# Altium footprint library PcbLib_ICs.PcbLib: 317 footprints (part 21 of 24) (continued)
## TQFP-44 [mm] "TQFP-44 10x10mm package with 0.8mm pitch"
height 1.2
pads (44):
  rect 1.45x0.55 smd paste+0 mask+0.08: 1(-5.725,4)
  oval 1.45x0.55 smd paste+0 mask+0.08: 2(-5.725,3.2) 3(-5.725,2.4) 4(-5.725,1.6) 5(-5.725,0.8) 6(-5.725,0) 7(-5.725,-0.8) 8(-5.725,-1.6) 9(-5.725,-2.4) 10(-5.725,-3.2) 11(-5.725,-4) 23(5.725,-4) 24(5.725,-3.2) 25(5.725,-2.4) 26(5.725,-1.6) 27(5.725,-0.8) 28(5.725,0) 29(5.725,0.8) 30(5.725,1.6) 31(5.725,2.4) 32(5.725,3.2) 33(5.725,4)
  oval 0.55x1.45 smd paste+0 mask+0.08: 12(-4,-5.725) 13(-3.2,-5.725) 14(-2.4,-5.725) 15(-1.6,-5.725) 16(-0.8,-5.725) 17(0,-5.725) 18(0.8,-5.725) 19(1.6,-5.725) 20(2.4,-5.725) 21(3.2,-5.725) 22(4,-5.725) 34(4,5.725) 35(3.2,5.725) 36(2.4,5.725) 37(1.6,5.725) 38(0.8,5.725) 39(0,5.725) 40(-0.8,5.725) 41(-1.6,5.725) 42(-2.4,5.725) 43(-3.2,5.725) 44(-4,5.725)
Top Overlay:
  circle w0.6: c-3.6,3.6 r0.3
  circle w0.25: c-5.725,4.825 r0.125
  lines w0.2: -5.2,-4.5 -5.2,-5.2 -4.5,-5.2 ; -5.2,4.5 -5.2,5.2 -4.5,5.2 ; 4.5,-5.2 5.2,-5.2 5.2,-4.5 ; 4.5,5.2 5.2,5.2 5.2,4.5
Top Assy:
  drawing of 665 lines, arcs and shapes, not listed
  text ".Designator" at -3.443,-0.467 h2
Top Text:
  lines w0.05: -6.7,-6.7 6.7,-6.7 6.7,6.7 -6.7,6.7 -6.7,-6.7
  lines w0.1: -0.5,0 0.5,0 ; 0,-0.5 0,0.5
3D body "User Library-TQFP44-1.step": height 1.1, standoff 0, extent -6.009,-6.009 6.009,6.009

## TQFP-100 (14x20) [mm] "TQFP, 100-Leads, Body 14.00x20.00mm, Pitch 0.65mm, IPC Medium Density"
height 1.45
pads (100):
  rect 1.45x0.5 smd paste+0 mask+0.075: 1(-7.725,9.425)
  oval 1.45x0.5 smd paste+0 mask+0.075: 2(-7.725,8.775) 3(-7.725,8.125) 4(-7.725,7.475) 5(-7.725,6.825) 6(-7.725,6.175) 7(-7.725,5.525) 8(-7.725,4.875) 9(-7.725,4.225) 10(-7.725,3.575) 11(-7.725,2.925) 12(-7.725,2.275) 13(-7.725,1.625) 14(-7.725,0.975) 15(-7.725,0.325) 16(-7.725,-0.325) 17(-7.725,-0.975) 18(-7.725,-1.625) 19(-7.725,-2.275) 20(-7.725,-2.925) 21(-7.725,-3.575) 22(-7.725,-4.225) 23(-7.725,-4.875) 24(-7.725,-5.525) 25(-7.725,-6.175) 26(-7.725,-6.825) 27(-7.725,-7.475) 28(-7.725,-8.125) 29(-7.725,-8.775) 30(-7.725,-9.425) 51(7.725,-9.425) 52(7.725,-8.775) 53(7.725,-8.125) 54(7.725,-7.475) 55(7.725,-6.825) 56(7.725,-6.175) 57(7.725,-5.525) 58(7.725,-4.875) 59(7.725,-4.225) 60(7.725,-3.575) 61(7.725,-2.925) 62(7.725,-2.275) 63(7.725,-1.625) 64(7.725,-0.975) 65(7.725,-0.325) 66(7.725,0.325) 67(7.725,0.975) 68(7.725,1.625) 69(7.725,2.275) 70(7.725,2.925) 71(7.725,3.575) 72(7.725,4.225) 73(7.725,4.875) 74(7.725,5.525) 75(7.725,6.175) 76(7.725,6.825) 77(7.725,7.475) 78(7.725,8.125) 79(7.725,8.775) 80(7.725,9.425)
  oval 0.5x1.45 smd paste+0 mask+0.075: 31(-6.175,-10.725) 32(-5.525,-10.725) 33(-4.875,-10.725) 34(-4.225,-10.725) 35(-3.575,-10.725) 36(-2.925,-10.725) 37(-2.275,-10.725) 38(-1.625,-10.725) 39(-0.975,-10.725) 40(-0.325,-10.725) 41(0.325,-10.725) 42(0.975,-10.725) 43(1.625,-10.725) 44(2.275,-10.725) 45(2.925,-10.725) 46(3.575,-10.725) 47(4.225,-10.725) 48(4.875,-10.725) 49(5.525,-10.725) 50(6.175,-10.725) 81(6.175,10.725) 82(5.525,10.725) 83(4.875,10.725) 84(4.225,10.725) 85(3.575,10.725) 86(2.925,10.725) 87(2.275,10.725) 88(1.625,10.725) 89(0.975,10.725) 90(0.325,10.725) 91(-0.325,10.725) 92(-0.975,10.725) 93(-1.625,10.725) 94(-2.275,10.725) 95(-2.925,10.725) 96(-3.575,10.725) 97(-4.225,10.725) 98(-4.875,10.725) 99(-5.525,10.725) 100(-6.175,10.725)
Top Overlay:
  circle w0.6: c-5.6,8.6 r0.3
  circle w0.25: c-7.725,10.225 r0.125
  lines w0.2: -9.425,-9.425 -8.775,-9.425 ; -9.425,-2.925 -8.775,-2.925 ; -9.425,3.575 -8.775,3.575 ; -9.425,9.425 -8.775,9.425 ; -7.225,-9.975 -7.225,-10.225 -6.725,-10.225 ; -7.225,9.975 -7.225,10.225 -6.725,10.225 ; -6.175,-12.35 -6.175,-11.7 ; -6.175,11.7 -6.175,12.35 ; -0.325,-12.35 -0.325,-11.7 ; 0.325,11.7 0.325,12.35 ; 6.175,-12.35 6.175,-11.7 ; 6.175,11.7 6.175,12.35 ; 6.725,-10.225 7.225,-10.225 7.225,-9.975 ; 6.725,10.225 7.225,10.225 7.225,9.975 ; 8.775,-9.425 9.425,-9.425 ; 8.775,-3.575 9.425,-3.575 ; 8.775,2.925 9.425,2.925 ; 8.775,9.425 9.425,9.425 ; -6.6,-9.6 6.6,-9.6 6.6,9.6 -6.6,9.6 -6.6,-9.6
Top Assy:
  drawing of 2638 lines, arcs and shapes, not listed
  text ".Designator" at -3.443,-0.467 h2
Top Text:
  lines w0.05: -8.7,-11.7 8.7,-11.7 8.7,11.7 -8.7,11.7 -8.7,-11.7
  lines w0.1: -0.5,0 0.5,0 ; 0,-0.5 0,0.5
3D body "TQFP-100 (14x20).step": height 1.45, standoff 0, extent -8,-11 8,11

## TSOC-6 [mm]
height 1.1
pads (6):
  rect 1.3x0.55 smd paste+0 mask+0.05: 1(-1.88,1.27)
  oval 1.3x0.55 smd paste+0 mask+0.05: 2(-1.88,0) 3(-1.88,-1.27) 4(1.88,-1.27) 5(1.88,0) 6(1.88,1.27)
Top Overlay:
  circle w0.25: c-3,2 r0.125
  lines w0.2: -2.3,-1.8 -2.3,-2.2 2.3,-2.2 2.3,-1.8 ; -2.3,1.8 -2.3,2.2 2.3,2.2 2.3,1.8
Top Assy:
  circle w0.05: c-1.159,1.303 r0.15
  lines w0.05: -1.859,-1.467 -2.059,-1.467 -2.059,-1.067 -1.859,-1.067 ; -1.859,-0.197 -2.059,-0.197 -2.059,0.203 -1.859,0.203 ; -1.859,1.073 -2.059,1.073 -2.059,1.473 -1.859,1.473 ; 1.929,-1.467 1.941,-1.467 ; 1.929,-1.067 1.941,-1.067 ; 1.929,-0.197 1.941,-0.197 ; 1.929,0.203 1.941,0.203 ; 1.929,1.073 1.941,1.073 ; 1.929,1.473 1.941,1.473 ; -1.859,-1.897 ccw(c-1.759,-1.897) -1.759,-1.997 -1.738,-1.997 ; -1.859,-1.897 -1.826,-1.897 ; -1.859,-1.897 -1.859,1.903 ; -1.859,1.903 cw(c-1.759,1.903) -1.829,1.974 cw(c-1.759,1.903) -1.759,2.003 -1.738,2.003 ; -1.859,1.903 -1.826,1.903 ; -1.826,-1.897 ccw(c-1.732,-1.903) -1.738,-1.997 ; -1.826,-1.897 -1.738,-1.897 ; -1.826,-1.897 -1.826,1.903 ; -1.826,1.903 cw(c-1.732,1.91) -1.738,2.003 ; -1.826,1.903 -1.738,1.903 ; -1.738,-1.997 -1.738,-1.897 ; -1.738,-1.997 1.732,-1.997 ; -1.738,-1.897 1.732,-1.897 ; -1.738,-1.897 -1.738,1.903 ; -1.738,1.903 -1.738,2.003 ; -1.738,1.903 1.732,1.903 ; -1.738,2.003 1.732,2.003 ; 1.732,-1.997 1.749,-1.994 1.762,-1.986 1.78,-1.967 1.789,-1.951 1.795,-1.933 1.8,-1.897 ; 1.732,-1.997 1.732,-1.897 ; 1.732,-1.997 1.841,-1.997 ccw(c1.841,-1.897) 1.941,-1.897 ; 1.732,-1.897 1.732,1.903 ; 1.732,-1.897 1.8,-1.897 ; 1.732,1.903 1.732,2.003 ; 1.732,1.903 1.8,1.903 ; 1.732,2.003 1.749,2 1.763,1.993 1.78,1.974 1.789,1.957 1.795,1.939 1.8,1.903 ; 1.732,2.003 1.841,2.003 cw(c1.841,1.903) 1.912,1.974 cw(c1.841,1.903) 1.941,1.903 ; 1.799,-1.897 1.941,-1.897 ; 1.799,-1.897 1.799,1.903 ; 1.799,1.903 1.941,1.903 ; 1.941,-1.897 1.941,-1.467 ; 1.941,-1.467 1.941,-1.067 ; 1.941,-1.467 2.141,-1.467 2.141,-1.067 1.941,-1.067 ; 1.941,-1.067 1.941,-0.197 ; 1.941,-0.197 1.941,0.203 ; 1.941,-0.197 2.141,-0.197 2.141,0.203 1.941,0.203 ; 1.941,0.203 1.941,1.073 ; 1.941,1.073 1.941,1.473 ; 1.941,1.073 2.141,1.073 2.141,1.473 1.941,1.473 ; 1.941,1.473 1.941,1.903
  text ".Designator" at -2.579,-0.349 h1.5
Top Text:
  lines w0.05: -2.7,-2.4 -2.7,2.4 2.7,2.4 2.7,-2.4 -2.7,-2.4
  lines w0.1: -0.5,0 0.5,0 ; 0,-0.5 0,0.5
3D body "User Library-TSOC6.STEP": height 1.4, standoff 0, extent -2.1,-2 2.1,2

## TSOP-5 [mm] "TSOP-5 package"
height 1.75
pads (5):
  rect 1.1x0.6 smd paste+0 mask+0.05: 1(-1.2,0.95)
  oval 1.1x0.6 smd paste+0 mask+0.05: 2(-1.2,0) 3(-1.2,-0.95) 4(1.2,-0.95) 5(1.2,0.95)
Top Overlay:
  circle w0.25: c-1.5,1.75 r0.125
  lines w0.2: -0.55,-1.6 0.55,-1.6 ; -0.55,1.6 0.55,1.6
Top Assy:
  circle w0.05: c-0.35,1 r0.1
  lines w0.05: 0.75,-0.16 0.75,-0.79 ; 0.75,-0.15 0.75,0.79 ; -1.176,-1.11 -1.148,-1.11 ; -1.176,-1.11 -1.35,-1.11 -1.35,-0.79 -1.176,-0.79 ; -1.176,-1.11 -1.176,-0.79 ; -1.176,-0.79 -1.148,-0.79 ; -1.176,-0.16 -1.148,-0.16 ; -1.176,-0.16 -1.35,-0.16 -1.35,0.16 -1.176,0.16 ; -1.176,-0.16 -1.176,0.16 ; -1.176,0.16 -1.148,0.16 ; -1.176,0.79 -1.148,0.79 ; -1.176,0.79 -1.35,0.79 -1.35,1.11 -1.176,1.11 ; -1.176,0.79 -1.176,1.11 ; -1.176,1.11 -1.148,1.11 ; -1.148,-1.11 -1.148,-0.79 ; -1.148,-1.11 -0.82,-1.11 ; -1.148,-0.79 -0.82,-0.79 ; -1.148,-0.16 -1.148,0.16 ; -1.148,-0.16 -0.82,-0.16 ; -1.148,0.16 -0.82,0.16 ; -1.148,0.79 -1.148,1.11 ; -1.148,0.79 -0.82,0.79 ; -1.148,1.11 -0.82,1.11 ; -0.82,-1.11 -0.75,-1.11 ; -0.82,-1.11 -0.82,-0.79 ; -0.82,-0.79 -0.75,-0.79 ; -0.82,-0.16 -0.75,-0.16 ; -0.82,-0.16 -0.82,0.16 ; -0.82,0.16 -0.75,0.16 ; -0.82,0.79 -0.75,0.79 ; -0.82,0.79 -0.82,1.11 ; -0.82,1.11 -0.75,1.11 ; -0.75,-1.5 -0.623,-1.373 ; -0.75,-1.5 0.75,-1.5 ; -0.75,-1.5 -0.75,-1.11 ; -0.75,-1.11 -0.75,-0.79 ; -0.75,-0.79 -0.75,-0.16 ; -0.75,-0.16 -0.75,0.16 ; -0.75,0.16 -0.75,0.79 ; -0.75,0.79 -0.75,1.11 ; -0.75,1.11 -0.75,1.5 ; -0.75,1.5 -0.623,1.373 ; -0.75,1.5 0.75,1.5 ; -0.623,-1.373 0.623,-1.373 ; -0.623,-1.373 -0.623,1.373 ; -0.623,1.373 0.623,1.373 ; 0.623,-1.373 0.623,1.373 ; 0.623,-1.373 0.75,-1.5 ; 0.623,1.373 0.75,1.5 ; 0.75,-1.5 0.75,-1.11 ; 0.75,-1.11 0.75,-0.79 ; 0.75,-1.11 0.82,-1.11 ; 0.75,-0.79 0.82,-0.79 ; 0.75,0.79 0.75,1.11 ; 0.75,0.79 0.82,0.79 ; 0.75,1.11 0.75,1.5 ; 0.75,1.11 0.82,1.11 ; 0.82,-1.11 1.148,-1.11 ; 0.82,-1.11 0.82,-0.79 ; 0.82,-0.79 1.148,-0.79 ; 0.82,0.79 1.148,0.79 ; 0.82,0.79 0.82,1.11 ; 0.82,1.11 1.148,1.11 ; 1.148,-1.11 1.148,-0.79 ; 1.148,-1.11 1.176,-1.11 ; 1.148,-0.79 1.176,-0.79 ; 1.148,0.79 1.148,1.11 ; 1.148,0.79 1.176,0.79 ; 1.148,1.11 1.176,1.11 ; 1.176,-1.11 1.35,-1.11 1.35,-0.79 1.176,-0.79 ; 1.176,-1.11 1.176,-0.79 ; 1.176,0.79 1.35,0.79 1.35,1.11 1.176,1.11 ; 1.176,0.79 1.176,1.11
  text ".Designator" at 0.28,-2.064 h1.2
Top Text:
  lines w0.1: -0.5,0 0.5,0 ; 0,-0.5 0,0.5
3D body "5-TSOP.step": height 1.1, standoff 0, extent -1.5,-1.55 1.5,1.55

## TSOP-6 [mm] "TSOP-6 package"
height 1.75
pads (6):
  rect 1.1x0.6 smd paste+0 mask+0.05: 1(-1.1,0.95)
  oval 1.1x0.6 smd paste+0 mask+0.05: 2(-1.1,0) 3(-1.1,-0.95) 4(1.1,-0.95) 5(1.1,0) 6(1.1,0.95)
Top Overlay:
  circle w0.25: c-1.5,1.75 r0.125
  lines w0.2: -0.55,-1.6 0.55,-1.6 ; -0.55,1.6 0.55,1.6
Top Assy:
  circle w0.05: c-0.35,1 r0.1
  lines w0.05: -1.176,-1.11 -1.176,-0.79 ; -1.176,-1.11 -1.35,-1.11 -1.35,-0.79 -1.176,-0.79 ; -1.176,-1.11 -1.148,-1.11 ; -1.176,-0.79 -1.148,-0.79 ; -1.176,-0.16 -1.176,0.16 ; -1.176,-0.16 -1.35,-0.16 -1.35,0.16 -1.176,0.16 ; -1.176,-0.16 -1.148,-0.16 ; -1.176,0.16 -1.148,0.16 ; -1.176,0.79 -1.176,1.11 ; -1.176,0.79 -1.35,0.79 -1.35,1.11 -1.176,1.11 ; -1.176,0.79 -1.148,0.79 ; -1.176,1.11 -1.148,1.11 ; -1.148,-1.11 -0.82,-1.11 ; -1.148,-1.11 -1.148,-0.79 ; -1.148,-0.79 -0.82,-0.79 ; -1.148,-0.16 -0.82,-0.16 ; -1.148,-0.16 -1.148,0.16 ; -1.148,0.16 -0.82,0.16 ; -1.148,0.79 -0.82,0.79 ; -1.148,0.79 -1.148,1.11 ; -1.148,1.11 -0.82,1.11 ; -0.82,-1.11 -0.82,-0.79 ; -0.82,-1.11 -0.75,-1.11 ; -0.82,-0.79 -0.75,-0.79 ; -0.82,-0.16 -0.82,0.16 ; -0.82,-0.16 -0.75,-0.16 ; -0.82,0.16 -0.75,0.16 ; -0.82,0.79 -0.82,1.11 ; -0.82,0.79 -0.75,0.79 ; -0.82,1.11 -0.75,1.11 ; -0.75,-1.5 -0.75,-1.11 ; -0.75,-1.5 0.75,-1.5 ; -0.75,-1.5 -0.623,-1.373 ; -0.75,-1.11 -0.75,-0.79 ; -0.75,-0.79 -0.75,-0.16 ; -0.75,-0.16 -0.75,0.16 ; -0.75,0.16 -0.75,0.79 ; -0.75,0.79 -0.75,1.11 ; -0.75,1.11 -0.75,1.5 ; -0.75,1.5 0.75,1.5 ; -0.75,1.5 -0.623,1.373 ; -0.623,-1.373 -0.623,1.373 ; -0.623,-1.373 0.623,-1.373 ; -0.623,1.373 0.623,1.373 ; 0.623,-1.373 0.75,-1.5 ; 0.623,-1.373 0.623,1.373 ; 0.623,1.373 0.75,1.5 ; 0.75,-1.5 0.75,-1.11 ; 0.75,-1.11 0.82,-1.11 ; 0.75,-1.11 0.75,-0.79 ; 0.75,-0.79 0.82,-0.79 ; 0.75,-0.79 0.75,-0.16 ; 0.75,-0.16 0.82,-0.16 ; 0.75,-0.16 0.75,0.16 ; 0.75,0.16 0.82,0.16 ; 0.75,0.16 0.75,0.79 ; 0.75,0.79 0.82,0.79 ; 0.75,0.79 0.75,1.11 ; 0.75,1.11 0.82,1.11 ; 0.75,1.11 0.75,1.5 ; 0.82,-1.11 0.82,-0.79 ; 0.82,-1.11 1.148,-1.11 ; 0.82,-0.79 1.148,-0.79 ; 0.82,-0.16 0.82,0.16 ; 0.82,-0.16 1.148,-0.16 ; 0.82,0.16 1.148,0.16 ; 0.82,0.79 0.82,1.11 ; 0.82,0.79 1.148,0.79 ; 0.82,1.11 1.148,1.11 ; 1.148,-1.11 1.176,-1.11 ; 1.148,-1.11 1.148,-0.79 ; 1.148,-0.79 1.176,-0.79 ; 1.148,-0.16 1.176,-0.16 ; 1.148,-0.16 1.148,0.16 ; 1.148,0.16 1.176,0.16 ; 1.148,0.79 1.176,0.79 ; 1.148,0.79 1.148,1.11 ; 1.148,1.11 1.176,1.11 ; 1.176,-1.11 1.176,-0.79 ; 1.176,-1.11 1.35,-1.11 1.35,-0.79 1.176,-0.79 ; 1.176,-0.16 1.176,0.16 ; 1.176,-0.16 1.35,-0.16 1.35,0.16 1.176,0.16 ; 1.176,0.79 1.176,1.11 ; 1.176,0.79 1.35,0.79 1.35,1.11 1.176,1.11
  text ".Designator" at 0.28,-2.064 h1.2
Top Text:
  lines w0.1: -0.5,0 0.5,0 ; 0,-0.5 0,0.5
3D body "User Library-TSOP-6.step": height 1, standoff 0, extent -1.35,-1.5 1.35,1.5

## TSOP-44 II [mm]
height 1.2
pads (44):
  rect 1.2x0.5 smd paste+0 mask+0.05: 1(-5.7,8.4)
  oval 1.2x0.5 smd paste+0 mask+0.05: 2(-5.7,7.6) 3(-5.7,6.8) 4(-5.7,6) 5(-5.7,5.2) 6(-5.7,4.4) 7(-5.7,3.6) 8(-5.7,2.8) 9(-5.7,2) 10(-5.7,1.2) 11(-5.7,0.4) 12(-5.7,-0.4) 13(-5.7,-1.2) 14(-5.7,-2) 15(-5.7,-2.8) 16(-5.7,-3.6) 17(-5.7,-4.4) 18(-5.7,-5.2) 19(-5.7,-6) 20(-5.7,-6.8) 21(-5.7,-7.6) 22(-5.7,-8.4) 23(5.7,8.4) 24(5.7,7.6) 25(5.7,6.8) 26(5.7,6) 27(5.7,5.2) 28(5.7,4.4) 29(5.7,3.6) 30(5.7,2.8) 31(5.7,2) 32(5.7,1.2) 33(5.7,0.4) 34(5.7,-0.4) 35(5.7,-1.2) 36(5.7,-2) 37(5.7,-2.8) 38(5.7,-3.6) 39(5.7,-4.4) 40(5.7,-5.2) 41(5.7,-6) 42(5.7,-6.8) 43(5.7,-7.6) 44(5.7,-8.4)
Top Overlay:
  circle w0.6: c-3.58,7.705 r0.3
  circle w0.25: c-5.7,9.2 r0.125
  lines w0.2: -4.8,-8.9 -4.8,8.9 4.8,8.9 4.8,-8.9 -4.8,-8.9
Top Assy:
  drawing of 1189 lines, arcs and shapes, not listed
  text ".Designator" at -3.443,-0.467 h2
Top Text:
  lines w0.1: -0.5,0 0.5,0 ; 0,-0.5 0,0.5
3D body "TSOP-44_II.STEP": height 1.1, standoff 0, extent -5.88,-9.205 5.88,9.205

## TSOP-48 I [mm] "TSSOP, 48-Leads, Body 12,00x18,40mm, Pitch 0,50mm, IPC Medium Density"
height 1.2
pads (48):
  rect 1.15x0.3 smd paste+0 mask+0.05: 1(-9.875,5.75)
  oval 1.15x0.3 smd paste+0 mask+0.05: 2(-9.875,5.25) 3(-9.875,4.75) 4(-9.875,4.25) 5(-9.875,3.75) 6(-9.875,3.25) 7(-9.875,2.75) 8(-9.875,2.25) 9(-9.875,1.75) 10(-9.875,1.25) 11(-9.875,0.75) 12(-9.875,0.25) 13(-9.875,-0.25) 14(-9.875,-0.75) 15(-9.875,-1.25) 16(-9.875,-1.75) 17(-9.875,-2.25) 18(-9.875,-2.75) 19(-9.875,-3.25) 20(-9.875,-3.75) 21(-9.875,-4.25) 22(-9.875,-4.75) 23(-9.875,-5.25) 24(-9.875,-5.75) 25(9.875,-5.75) 26(9.875,-5.25) 27(9.875,-4.75) 28(9.875,-4.25) 29(9.875,-3.75) 30(9.875,-3.25) 31(9.875,-2.75) 32(9.875,-2.25) 33(9.875,-1.75) 34(9.875,-1.25) 35(9.875,-0.75) 36(9.875,-0.25) 37(9.875,0.25) 38(9.875,0.75) 39(9.875,1.25) 40(9.875,1.75) 41(9.875,2.25) 42(9.875,2.75) 43(9.875,3.25) 44(9.875,3.75) 45(9.875,4.25) 46(9.875,4.75) 47(9.875,5.25) 48(9.875,5.75)
Top Overlay:
  circle w0.6: c-7.9,5.1 r0.3
  circle w0.25: c-9.875,6.45 r0.125
  lines w0.2: -8.9,-6.1 8.9,-6.1 8.9,6.1 -8.9,6.1 -8.9,-6.1
Top Assy:
  drawing of 731 lines, arcs and shapes, not listed
  text ".Designator" at -3.443,-0.467 h2
Top Text:
  lines w0.05: -10.7,-6.35 10.7,-6.35 10.7,6.35 -10.7,6.35 -10.7,-6.35
  lines w0.1: -0.5,0 0.5,0 ; 0,-0.5 0,0.5
3D body "User Library-TSOP-48.STEP": height 1.05, standoff -0.05, extent -10.002,-6 10.002,6

## TSOP-86 II [mm] "TSOP, 86-Leads, Body 22,22x10,16mm, Pitch 0,50mm, IPC Medium Density"
height 1.2
pads (86):
  rect 1.2x0.3 smd paste+0 mask+0.05: 1(-5.75,10.5)
  oval 1.2x0.3 smd paste+0 mask+0.05: 2(-5.75,10) 3(-5.75,9.5) 4(-5.75,9) 5(-5.75,8.5) 6(-5.75,8) 7(-5.75,7.5) 8(-5.75,7) 9(-5.75,6.5) 10(-5.75,6) 11(-5.75,5.5) 12(-5.75,5) 13(-5.75,4.5) 14(-5.75,4) 15(-5.75,3.5) 16(-5.75,3) 17(-5.75,2.5) 18(-5.75,2) 19(-5.75,1.5) 20(-5.75,1) 21(-5.75,0.5) 22(-5.75,0) 23(-5.75,-0.5) 24(-5.75,-1) 25(-5.75,-1.5) 26(-5.75,-2) 27(-5.75,-2.5) 28(-5.75,-3) 29(-5.75,-3.5) 30(-5.75,-4) 31(-5.75,-4.5) 32(-5.75,-5) 33(-5.75,-5.5) 34(-5.75,-6) 35(-5.75,-6.5) 36(-5.75,-7) 37(-5.75,-7.5) 38(-5.75,-8) 39(-5.75,-8.5) 40(-5.75,-9) 41(-5.75,-9.5) 42(-5.75,-10) 43(-5.75,-10.5) 44(5.75,-10.5) 45(5.75,-10) 46(5.75,-9.5) 47(5.75,-9) 48(5.75,-8.5) 49(5.75,-8) 50(5.75,-7.5) 51(5.75,-7) 52(5.75,-6.5) 53(5.75,-6) 54(5.75,-5.5) 55(5.75,-5) 56(5.75,-4.5) 57(5.75,-4) 58(5.75,-3.5) 59(5.75,-3) 60(5.75,-2.5) 61(5.75,-2) 62(5.75,-1.5) 63(5.75,-1) 64(5.75,-0.5) 65(5.75,0) 66(5.75,0.5) 67(5.75,1) 68(5.75,1.5) 69(5.75,2) 70(5.75,2.5) 71(5.75,3) 72(5.75,3.5) 73(5.75,4) 74(5.75,4.5) 75(5.75,5) 76(5.75,5.5) 77(5.75,6) 78(5.75,6.5) 79(5.75,7) 80(5.75,7.5) 81(5.75,8) 82(5.75,8.5) 83(5.75,9) 84(5.75,9.5) 85(5.75,10) 86(5.75,10.5)
Top Overlay:
  circle w0.25: c-5.75,11.2 r0.125
  circle w0.6: c-3.75,10.175 r0.3
  lines w0.2: -4.75,-11.175 -4.75,11.175 4.75,11.175 4.75,-11.175 -4.75,-11.175
Top Assy:
  drawing of 1393 lines, arcs and shapes, not listed
Top Text:
  lines w0.05: -6.6,-11.45 -6.6,11.45 6.6,11.45 6.6,-11.45 -6.6,-11.45
  lines w0.1: -0.5,0 0.5,0 ; 0,-0.5 0,0.5
3D body "User Library-TSOP-86.STEP": height 1.06, standoff -0.03, extent -5.895,-10.994 5.895,11

## TSOT23-5 [mm] "SOT23, 5-Leads, Body 2,90x2,80mm, Pitch 0,95mm, IPC Medium Density"
height 1
pads (5):
  rect 0.95x0.55 smd paste+0 mask+0.05: 1(-1.35,0.95)
  oval 0.95x0.55 smd paste+0 mask+0.05: 2(-1.35,0) 3(-1.35,-0.95) 4(1.35,-0.95) 5(1.35,0.95)
Top Overlay:
  circle w0.25: c-1.35,1.775 r0.125
  lines w0.2: -0.5,-1.5 -0.5,1.5 0.5,1.5 0.5,-1.5 -0.5,-1.5
Top Assy:
  circle w0.05: c-0.4,1.1 r0.1
  lines w0.05: -0.813,-1.138 -0.813,-1.45 ; -0.813,-0.763 -0.813,-0.188 ; -0.813,0.187 -0.813,0.762 ; -0.813,1.137 -0.813,1.45 ; 0.813,-1.138 0.813,-1.45 ; 0.813,-0.763 0.813,0.762 ; 0.813,1.137 0.813,1.45 ; -1.232,-1.138 -1.232,-0.763 ; -1.232,-1.138 -1.399,-1.138 -1.399,-0.763 -1.232,-0.763 ; -1.232,-1.138 -1.213,-1.138 ; -1.232,-0.763 -1.213,-0.763 ; -1.232,-0.188 -1.232,0.187 ; -1.232,-0.188 -1.399,-0.188 -1.399,0.187 -1.232,0.187 ; -1.232,-0.188 -1.213,-0.188 ; -1.232,0.187 -1.213,0.187 ; -1.232,0.762 -1.232,1.137 ; -1.232,0.762 -1.399,0.762 -1.399,1.137 -1.232,1.137 ; -1.232,0.762 -1.213,0.762 ; -1.232,1.137 -1.213,1.137 ; -1.213,-1.138 -1.213,-0.763 ; -1.213,-1.138 -1.058,-1.138 ; -1.213,-0.763 -1.058,-0.763 ; -1.213,-0.188 -1.213,0.187 ; -1.213,-0.188 -1.058,-0.188 ; -1.213,0.187 -1.058,0.187 ; -1.213,0.762 -1.213,1.137 ; -1.213,0.762 -1.058,0.762 ; -1.213,1.137 -1.058,1.137 ; -1.058,-1.138 -1.058,-0.763 ; -1.058,-1.138 -0.898,-1.138 ; -1.058,-0.763 -0.898,-0.763 ; -1.058,-0.188 -1.058,0.187 ; -1.058,-0.188 -0.898,-0.188 ; -1.058,0.187 -0.898,0.187 ; -1.058,0.762 -1.058,1.137 ; -1.058,0.762 -0.898,0.762 ; -1.058,1.137 -0.898,1.137 ; -0.898,-1.138 -0.898,-0.763 ; -0.898,-1.138 -0.76,-1.138 -0.76,-0.763 -0.898,-0.763 ; -0.898,-0.188 -0.898,0.187 ; -0.898,-0.188 -0.76,-0.188 -0.76,0.187 -0.898,0.187 ; -0.898,0.762 -0.898,1.137 ; -0.898,0.762 -0.76,0.762 -0.76,1.137 -0.898,1.137 ; -0.813,-1.45 0.813,-1.45 ; -0.813,-1.45 -0.663,-1.35 ; -0.813,1.45 0.813,1.45 ; -0.813,1.45 -0.663,1.35 ; -0.663,-1.35 0.663,-1.35 ; -0.663,-1.35 -0.663,1.35 ; -0.663,1.35 0.663,1.35 ; 0.663,-1.35 0.663,1.35 ; 0.663,-1.35 0.813,-1.45 ; 0.663,1.35 0.813,1.45 ; 0.898,-1.138 0.898,-0.763 ; 0.898,-1.138 1.058,-1.138 ; 0.898,-1.138 0.76,-1.138 0.76,-0.763 0.898,-0.763 ; 0.898,-0.763 1.058,-0.763 ; 0.898,0.762 0.898,1.137 ; 0.898,0.762 1.058,0.762 ; 0.898,0.762 0.76,0.762 0.76,1.137 0.898,1.137 ; 0.898,1.137 1.058,1.137 ; 1.058,-1.138 1.058,-0.763 ; 1.058,-1.138 1.213,-1.138 ; 1.058,-0.763 1.213,-0.763 ; 1.058,0.762 1.058,1.137 ; 1.058,0.762 1.213,0.762 ; 1.058,1.137 1.213,1.137 ; 1.213,-1.138 1.213,-0.763 ; 1.213,-1.138 1.232,-1.138 ; 1.213,-0.763 1.232,-0.763 ; 1.213,0.762 1.213,1.137 ; 1.213,0.762 1.232,0.762 ; 1.213,1.137 1.232,1.137 ; 1.232,-1.138 1.232,-0.763 ; 1.232,-1.138 1.399,-1.138 1.399,-0.763 1.232,-0.763 ; 1.232,0.762 1.232,1.137 ; 1.232,0.762 1.399,0.762 1.399,1.137 1.232,1.137
  text ".Designator" at 0.233,-1.719 h1
Top Text:
  lines w0.05: -2.075,-1.75 2.075,-1.75 2.075,1.75 -2.075,1.75 -2.075,-1.75
  lines w0.1: -0.5,0 0.5,0 ; 0,-0.5 0,0.5
3D body "TSOT23-5.step": height 1, standoff 0, extent -1.4,-1.5 1.4,1.5

## TSOT23-6 [mm]
pads (6):
  rect 1.3x0.65 smd paste+0 mask+0.05: 1(-1.31,0.95)
  oval 1.3x0.65 smd paste+0 mask+0.05: 2(-1.31,0) 3(-1.31,-0.95) 4(1.31,-0.95) 5(1.31,0) 6(1.31,0.95)
Top Overlay:
  circle w0.25: c-1.4,1.8 r0.125
  lines w0.2: -0.663,-1.5 0.663,-1.5 ; -0.663,1.5 0.663,1.5
Top Assy:
  circle w0.05: c-0.4,1.1 r0.1
  lines w0.05: -0.813,-1.138 -0.813,-1.45 ; -0.813,-0.763 -0.813,-0.188 ; -0.813,0.187 -0.813,0.762 ; -0.813,1.137 -0.813,1.45 ; 0.813,-1.138 0.813,-1.45 ; 0.813,-0.763 0.813,-0.188 ; 0.813,0.187 0.813,0.762 ; 0.813,1.137 0.813,1.45 ; -1.232,-1.138 -1.213,-1.138 ; -1.232,-1.138 -1.399,-1.138 -1.399,-0.763 -1.232,-0.763 ; -1.232,-1.138 -1.232,-0.763 ; -1.232,-0.763 -1.213,-0.763 ; -1.232,-0.188 -1.213,-0.188 ; -1.232,-0.188 -1.399,-0.188 -1.399,0.187 -1.232,0.187 ; -1.232,-0.188 -1.232,0.187 ; -1.232,0.187 -1.213,0.187 ; -1.232,0.762 -1.213,0.762 ; -1.232,0.762 -1.399,0.762 -1.399,1.137 -1.232,1.137 ; -1.232,0.762 -1.232,1.137 ; -1.232,1.137 -1.213,1.137 ; -1.213,-1.138 -1.058,-1.138 ; -1.213,-1.138 -1.213,-0.763 ; -1.213,-0.763 -1.058,-0.763 ; -1.213,-0.188 -1.058,-0.188 ; -1.213,-0.188 -1.213,0.187 ; -1.213,0.187 -1.058,0.187 ; -1.213,0.762 -1.058,0.762 ; -1.213,0.762 -1.213,1.137 ; -1.213,1.137 -1.058,1.137 ; -1.058,-1.138 -0.898,-1.138 ; -1.058,-1.138 -1.058,-0.763 ; -1.058,-0.763 -0.898,-0.763 ; -1.058,-0.188 -0.898,-0.188 ; -1.058,-0.188 -1.058,0.187 ; -1.058,0.187 -0.898,0.187 ; -1.058,0.762 -0.898,0.762 ; -1.058,0.762 -1.058,1.137 ; -1.058,1.137 -0.898,1.137 ; -0.898,-1.138 -0.76,-1.138 -0.76,-0.763 -0.898,-0.763 ; -0.898,-1.138 -0.898,-0.763 ; -0.898,-0.188 -0.76,-0.188 -0.76,0.187 -0.898,0.187 ; -0.898,-0.188 -0.898,0.187 ; -0.898,0.762 -0.76,0.762 -0.76,1.137 -0.898,1.137 ; -0.898,0.762 -0.898,1.137 ; -0.813,-1.45 -0.663,-1.35 ; -0.813,-1.45 0.813,-1.45 ; -0.813,1.45 -0.663,1.35 ; -0.813,1.45 0.813,1.45 ; -0.663,-1.35 -0.663,1.35 ; -0.663,-1.35 0.663,-1.35 ; -0.663,1.35 0.663,1.35 ; 0.663,-1.35 0.813,-1.45 ; 0.663,-1.35 0.663,1.35 ; 0.663,1.35 0.813,1.45 ; 0.898,-1.138 0.898,-0.763 ; 0.898,-1.138 1.058,-1.138 ; 0.898,-1.138 0.76,-1.138 0.76,-0.763 0.898,-0.763 ; 0.898,-0.763 1.058,-0.763 ; 0.898,-0.188 0.898,0.187 ; 0.898,-0.188 1.058,-0.188 ; 0.898,-0.188 0.76,-0.188 0.76,0.187 0.898,0.187 ; 0.898,0.187 1.058,0.187 ; 0.898,0.762 0.898,1.137 ; 0.898,0.762 1.058,0.762 ; 0.898,0.762 0.76,0.762 0.76,1.137 0.898,1.137 ; 0.898,1.137 1.058,1.137 ; 1.058,-1.138 1.058,-0.763 ; 1.058,-1.138 1.213,-1.138 ; 1.058,-0.763 1.213,-0.763 ; 1.058,-0.188 1.058,0.187 ; 1.058,-0.188 1.213,-0.188 ; 1.058,0.187 1.213,0.187 ; 1.058,0.762 1.058,1.137 ; 1.058,0.762 1.213,0.762 ; 1.058,1.137 1.213,1.137 ; 1.213,-1.138 1.213,-0.763 ; 1.213,-1.138 1.232,-1.138 ; 1.213,-0.763 1.232,-0.763 ; 1.213,-0.188 1.213,0.187 ; 1.213,-0.188 1.232,-0.188 ; 1.213,0.187 1.232,0.187 ; 1.213,0.762 1.213,1.137 ; 1.213,0.762 1.232,0.762 ; 1.213,1.137 1.232,1.137 ; 1.232,-1.138 1.232,-0.763 ; 1.232,-1.138 1.399,-1.138 1.399,-0.763 1.232,-0.763 ; 1.232,-0.188 1.232,0.187 ; 1.232,-0.188 1.399,-0.188 1.399,0.187 1.232,0.187 ; 1.232,0.762 1.232,1.137 ; 1.232,0.762 1.399,0.762 1.399,1.137 1.232,1.137
  text ".Designator" at 0.233,-1.719 h1
Top Text:
  lines w0.1: -0.5,0 0.5,0 ; 0,-0.5 0,0.5
3D body "User Library-TSOT-23-6(S6).step": height 1, standoff 0, extent -1.412,-1.45 1.412,1.45

## TSSOP-6 [mm]
height 1.1
pads (6):
  rect 0.7x0.3 smd paste+0 mask+0.05: 1(-0.95,0.65)
  oval 0.7x0.3 smd paste+0 mask+0.05: 2(-0.95,0) 3(-0.95,-0.65) 4(0.95,-0.65) 5(0.95,0) 6(0.95,0.65)
Top Overlay:
  circle w0.25: c-1.2,1.3 r0.125
  lines w0.2: -0.7,-1.2 0.7,-1.2 ; -0.7,1.2 0.7,1.2
Top Assy:
  circle w0.05: c-0.375,0.75 r0.15
  lines w0.05: -0.625,-0.775 -0.625,-1 ; -0.625,-0.525 -0.625,-0.125 ; -0.625,0.125 -0.625,0.525 ; -0.625,0.775 -0.625,1 ; 0.625,-0.775 0.625,-1 ; 0.625,-0.525 0.625,-0.125 ; 0.625,0.125 0.625,0.525 ; 0.625,0.775 0.625,1 ; -0.878,-0.775 -0.878,-0.525 ; -0.878,-0.775 -0.828,-0.775 ; -0.878,-0.775 -1.05,-0.775 -1.05,-0.525 -0.878,-0.525 ; -0.878,-0.525 -0.828,-0.525 ; -0.878,-0.125 -0.878,0.125 ; -0.878,-0.125 -0.828,-0.125 ; -0.878,-0.125 -1.05,-0.125 -1.05,0.125 -0.878,0.125 ; -0.878,0.125 -0.828,0.125 ; -0.878,0.525 -0.878,0.775 ; -0.878,0.525 -0.828,0.525 ; -0.878,0.525 -1.05,0.525 -1.05,0.775 -0.878,0.775 ; -0.878,0.775 -0.828,0.775 ; -0.828,-0.775 -0.828,-0.525 ; -0.828,-0.775 -0.796,-0.775 ; -0.828,-0.525 -0.796,-0.525 ; -0.828,-0.125 -0.828,0.125 ; -0.828,-0.125 -0.796,-0.125 ; -0.828,0.125 -0.796,0.125 ; -0.828,0.525 -0.828,0.775 ; -0.828,0.525 -0.796,0.525 ; -0.828,0.775 -0.796,0.775 ; -0.796,-0.775 -0.646,-0.775 ; -0.796,-0.775 -0.796,-0.525 ; -0.796,-0.525 -0.646,-0.525 ; -0.796,-0.125 -0.646,-0.125 ; -0.796,-0.125 -0.796,0.125 ; -0.796,0.125 -0.646,0.125 ; -0.796,0.525 -0.646,0.525 ; -0.796,0.525 -0.796,0.775 ; -0.796,0.775 -0.646,0.775 ; -0.646,-0.775 -0.646,-0.525 ; -0.646,-0.775 -0.615,-0.775 -0.615,-0.525 -0.646,-0.525 ; -0.646,-0.125 -0.615,-0.125 -0.615,0.125 -0.646,0.125 ; -0.646,-0.125 -0.646,0.125 ; -0.646,0.525 -0.646,0.775 ; -0.646,0.525 -0.615,0.525 -0.615,0.775 -0.646,0.775 ; -0.625,-1 -0.575,-0.95 ; -0.625,-1 0.625,-1 ; -0.625,1 -0.575,0.95 ; -0.625,1 0.625,1 ; -0.575,-0.95 0.575,-0.95 ; -0.575,-0.95 -0.575,0.95 ; -0.575,0.95 0.575,0.95 ; 0.575,-0.95 0.575,0.95 ; 0.575,-0.95 0.625,-1 ; 0.575,0.95 0.625,1 ; 0.646,-0.775 0.646,-0.525 ; 0.646,-0.775 0.615,-0.775 0.615,-0.525 0.646,-0.525 ; 0.646,-0.775 0.796,-0.775 ; 0.646,-0.525 0.796,-0.525 ; 0.646,-0.125 0.796,-0.125 ; 0.646,-0.125 0.646,0.125 ; 0.646,-0.125 0.615,-0.125 0.615,0.125 0.646,0.125 ; 0.646,0.125 0.796,0.125 ; 0.646,0.525 0.646,0.775 ; 0.646,0.525 0.796,0.525 ; 0.646,0.525 0.615,0.525 0.615,0.775 0.646,0.775 ; 0.646,0.775 0.796,0.775 ; 0.796,-0.775 0.796,-0.525 ; 0.796,-0.775 0.828,-0.775 ; 0.796,-0.525 0.828,-0.525 ; 0.796,-0.125 0.796,0.125 ; 0.796,-0.125 0.828,-0.125 ; 0.796,0.125 0.828,0.125 ; 0.796,0.525 0.796,0.775 ; 0.796,0.525 0.828,0.525 ; 0.796,0.775 0.828,0.775 ; 0.828,-0.775 0.828,-0.525 ; 0.828,-0.775 0.878,-0.775 ; 0.828,-0.525 0.878,-0.525 ; 0.828,-0.125 0.828,0.125 ; 0.828,-0.125 0.878,-0.125 ; 0.828,0.125 0.878,0.125 ; 0.828,0.525 0.828,0.775 ; 0.828,0.525 0.878,0.525 ; 0.828,0.775 0.878,0.775 ; 0.878,-0.775 0.878,-0.525 ; 0.878,-0.775 1.05,-0.775 1.05,-0.525 0.878,-0.525 ; 0.878,-0.125 0.878,0.125 ; 0.878,-0.125 1.05,-0.125 1.05,0.125 0.878,0.125 ; 0.878,0.525 0.878,0.775 ; 0.878,0.525 1.05,0.525 1.05,0.775 0.878,0.775
  text ".Designator" at 0.28,-2.064 h1.2
Top Text:
  lines w0.05: -1.5,-1.2 1.5,-1.2 1.5,1.2 -1.5,1.2 -1.5,-1.2
  lines w0.1: -0.5,0 0.5,0 ; 0,-0.5 0,0.5
3D body "TSSOP-6.STEP": height 1.1, standoff 0, extent -1.05,-1 1.05,1